# Altium schematic symbol library Regulator_Switching.SchLib: 1120 symbols (part 2 of 8) (continued)
## LM2841Y
designator *  value LM2841Y  Reference: U
ki_keywords: Miniature Step-Down Buck Voltage Regulator; ki_description: 300mA 42V Input Step-Down DC-DC Regulator, Adjustable Output Voltage, 1.25MHz, TSOT-23-5; ki_fp_filters: TSOT?23*; Footprint: Package_TO_SOT_SMD:TSOT-23-6; Datasheet: http://www.ti.com/lit/ds/symlink/lm2842-q1.pdf
pins: 1 BOOST, 2 GND, 3 FB, 4 EN, 5 VIN, 6 SW

## LM2842X
designator *  value LM2842X  Reference: U
ki_keywords: Miniature Step-Down Buck Voltage Regulator; ki_description: 600mA 42V Input Step-Down DC-DC Regulator, Adjustable Output Voltage, 550kHz, TSOT-23-5; ki_fp_filters: TSOT?23*; Footprint: Package_TO_SOT_SMD:TSOT-23-6; Datasheet: http://www.ti.com/lit/ds/symlink/lm2842-q1.pdf
pins: 1 BOOST, 2 GND, 3 FB, 4 EN, 5 VIN, 6 SW

## LM2842Y
designator *  value LM2842Y  Reference: U
ki_keywords: Miniature Step-Down Buck Voltage Regulator; ki_description: 600mA 42V Input Step-Down DC-DC Regulator, Adjustable Output Voltage, 1.25MHz, TSOT-23-5; ki_fp_filters: TSOT?23*; Footprint: Package_TO_SOT_SMD:TSOT-23-6; Datasheet: http://www.ti.com/lit/ds/symlink/lm2842-q1.pdf
pins: 1 BOOST, 2 GND, 3 FB, 4 EN, 5 VIN, 6 SW

## LM3150MH
designator *  value LM3150MH  Reference: U
ki_keywords: Buck step-down converter; ki_description: 42V Wide Vin synchronous Buck controller, HTSSOP-14; ki_fp_filters: HTSSOP*4.4x5mm*P0.65*; Footprint: Package_SO:HTSSOP-14-1EP_4.4x5mm_P0.65mm_EP3.4x5mm_Mask3x3.1mm; Datasheet: http://www.ti.com/lit/ds/symlink/lm3150.pdf
pins: 1 VCC, 2 VIN, 3 EN, 4 FB, 5 SGND, 6 SS, 7 RON, 8 ILIM, 9 SGND hidden, 10 SW, 11 HG, 12 BST, 13 LG, 14 PGND, 15 SGND hidden

## LM3407MY
designator *  value LM3407MY  Reference: U
ki_keywords: LED Step-Down Switching Regulator; ki_description: LED Lighting CC Floating Buck Switching Regulator, MSOP-8; ki_fp_filters: MSOP*1EP*3x3mm*P0.65mm*; Footprint: Package_SO:MSOP-8-1EP_3x3mm_P0.65mm_EP1.73x1.85mm_ThermalVias; Datasheet: http://www.ti.com/lit/ds/symlink/lm3407.pdf
pins: 1 ISNS, 2 DIM, 3 EN, 4 FS, 5 VIN, 6 VCC, 7 GND, 8 LX, 9 GNDPAD

## LM3578
designator *  value LM3578  Reference: U
ki_keywords: switching regulator; ki_description: 750mA, Switching Regulator, adjustable output voltage, DIP-8/SOIC-8; ki_fp_filters: DIP*W7.62mm* SOIC*3.9x4.9mm*; Datasheet: http://www.ti.com/lit/ds/symlink/lm3578a.pdf
pins: 1 E-, 2 E+, 3 CAP, 4 GND, 5 E, 6 C, 7 ILIM, 8 VIN

## LM3670MF
designator *  value LM3670MF  Reference: U
ki_keywords: DC-DC buck converter step down voltage regulator; ki_description: Miniature Step-Down DC-DC Converter for Ultralow Voltage Circuits, 2.5V < Vin < 5.5V, adjustable output voltage, SOT-23-5; ki_fp_filters: TSOT?23*; Footprint: Package_TO_SOT_SMD:TSOT-23-5; Datasheet: http://www.ti.com/lit/ds/symlink/lm3670.pdf
pins: 1 Vin, 2 GND, 3 EN, 4 FB, 5 SW

## LM5001MA
designator *  value LM5001MA  Reference: U
ki_keywords: High-Voltage Switch-mode Regulator Flyback SEPIC Boost; ki_description: 1A, High Voltage (75V) Switch-Mode Regulator, Adjustable Output Voltage, SOIC-8; ki_fp_filters: SOIC*3.9x4.9mm*P1.27mm*; Footprint: Package_SO:SOIC-8_3.9x4.9mm_P1.27mm; Datasheet: http://www.ti.com/lit/ds/symlink/lm5001.pdf
pins: 1 SW, 2 VIN, 3 VCC, 4 GND, 5 RT, 6 FB, 7 COMP, 8 EN

## LM5006MM
designator *  value LM5006MM  Reference: U
ki_keywords: Constant On-Time Buck Switching Regulator; ki_description: 600mA, 80V Constant On-Time Buck Switching Regulator, MSOP-10; ki_fp_filters: MSOP*3x3mm*P0.5mm*; Footprint: Package_SO:MSOP-10_3x3mm_P0.5mm; Datasheet: http://www.ti.com/lit/ds/symlink/lm5006.pdf
pins: 1 SW, 2 BST, 3 LG, 4 RTN, 5 UV, 6 UVO, 7 FB, 8 RT/SD, 9 VCC, 10 VIN

## LM5007MM
designator *  value LM5007MM  Reference: U
ki_keywords: Step-Down Switching Regulator; ki_description: 700mA, High Voltage (80V) Step-Down Switching Regulator, Adjustable Output Voltage, MSOP-8; ki_fp_filters: MSOP*3x3mm*P0.65mm*; Footprint: Package_SO:MSOP-8_3x3mm_P0.65mm; Datasheet: http://www.ti.com/lit/ds/symlink/lm5007.pdf
pins: 1 SW, 2 BST, 3 RCL, 4 RTN, 5 FB, 6 RON/SD, 7 VCC, 8 VIN

## LM5007SD
designator *  value LM5007SD  Reference: U
ki_keywords: Step-Down Switching Regulator; ki_description: 700mA, High Voltage (80V) Step-Down Switching Regulator, Adjustable Output Voltage, WSON-8; ki_fp_filters: WSON*1EP*4x4mm*P0.8mm*; Footprint: Package_SON:WSON-8-1EP_4x4mm_P0.8mm_EP2.6x3mm; Datasheet: http://www.ti.com/lit/ds/symlink/lm5007.pdf
pins: 1 SW, 2 BST, 3 RCL, 4 RTN, 5 FB, 6 RON/SD, 7 VCC, 8 VIN, 9 PAD

## LM5008MM
designator *  value LM5008MM  Reference: U
ki_keywords: Step-Down Switching Regulator; ki_description: 500mA, High Voltage (100V) Step-Down Switching Regulator, Adjustable Output Voltage, MSOP-8; ki_fp_filters: MSOP*3x3mm*P0.65mm*; Footprint: Package_SO:MSOP-8_3x3mm_P0.65mm; Datasheet: http://www.ti.com/lit/ds/symlink/lm5008.pdf
pins: 1 SW, 2 BST, 3 RCL, 4 RTN, 5 FB, 6 RON/SD, 7 VCC, 8 VIN

## LM5008SD
designator *  value LM5008SD  Reference: U
ki_keywords: Step-Down Switching Regulator; ki_description: 500mA, High Voltage (100V) Step-Down Switching Regulator, Adjustable Output Voltage, WSON-8; ki_fp_filters: WSON*1EP*4x4mm*P0.8mm*; Footprint: Package_SON:WSON-8-1EP_4x4mm_P0.8mm_EP2.6x3mm; Datasheet: http://www.ti.com/lit/ds/symlink/lm5008.pdf
pins: 1 SW, 2 BST, 3 RCL, 4 RTN, 5 FB, 6 RON/SD, 7 VCC, 8 VIN, 9 PAD

## LM5009MM
designator *  value LM5009MM  Reference: U
ki_keywords: Step-Down Switching Regulator; ki_description: 150mA, High Voltage (80V) Step-Down Switching Regulator, Adjustable Output Voltage, MSOP-8; ki_fp_filters: MSOP*3x3mm*P0.65mm*; Footprint: Package_SO:MSOP-8_3x3mm_P0.65mm; Datasheet: http://www.ti.com/lit/ds/symlink/lm5009.pdf
pins: 1 SW, 2 BST, 3 RCL, 4 RTN, 5 FB, 6 RON/SD, 7 VCC, 8 VIN

## LM5009SD
designator *  value LM5009SD  Reference: U
ki_keywords: Step-Down Switching Regulator; ki_description: 500mA, High Voltage (80V) Step-Down Switching Regulator, Adjustable Output Voltage, WSON-8; ki_fp_filters: WSON*1EP*4x4mm*P0.8mm*; Footprint: Package_SON:WSON-8-1EP_4x4mm_P0.8mm_EP2.6x3mm; Datasheet: http://www.ti.com/lit/ds/symlink/lm5009.pdf
pins: 1 SW, 2 BST, 3 RCL, 4 RTN, 5 FB, 6 RON/SD, 7 VCC, 8 VIN, 9 PAD

## LM5017MR
designator *  value LM5017MR  Reference: U
ki_keywords: Step-Down Switching Regulator High Voltage; ki_description: 600mA, 100V Step-Down Switching Regulator, PowerSO-8; ki_fp_filters: SOIC*1EP*3.9x4.9mm*P1.27mm*; Footprint: Package_SO:SOIC-8-1EP_3.9x4.9mm_P1.27mm_EP2.95x4.9mm_Mask2.71x3.4mm_ThermalVias; Datasheet: http://www.ti.com/lit/ds/symlink/lm5017.pdf
pins: 1 RTN, 2 VIN, 3 ULVO, 4 RON, 5 FB, 6 VCC, 7 BST, 8 SW, 9 RTNPAD

## LM5017SD
designator *  value LM5017SD  Reference: U
ki_keywords: Step-Down Switching Regulator High Voltage; ki_description: 600mA, 100V Step-Down Switching Regulator, WSON-8; ki_fp_filters: WSON*1EP*4x4mm*P0.8mm*; Footprint: Package_SON:WSON-8-1EP_4x4mm_P0.8mm_EP1.98x3mm; Datasheet: http://www.ti.com/lit/ds/symlink/lm5017.pdf
pins: 1 RTN, 2 VIN, 3 ULVO, 4 RON, 5 FB, 6 VCC, 7 BST, 8 SW, 9 RTNPAD

## LM5022MM
designator *  value LM5022MM  Reference: U
ki_keywords: boost switching controller; ki_description: 60-V Low-Side Controller for Boost and SEPIC, MSOP-10; ki_fp_filters: MSOP*3x3mm*P0.5mm*; Footprint: Package_SO:MSOP-10_3x3mm_P0.5mm; Datasheet: http://www.ti.com/lit/ds/symlink/lm5022.pdf
pins: 1 VIN, 2 FB, 3 COMP, 4 VCC, 5 OUT, 6 GND, 7 UVLO, 8 CS, 9 RT, 10 SS

## LM5088-1
designator *  value LM5088-1  Reference: U
ki_keywords: step down buck high voltage; ki_description: Wide Input Range Non-Synchronous Buck Controller, Frequency Dithering, 75V, HTSSOP-16; ki_fp_filters: HTSSOP*1EP*4.4x5mm*P0.65mm*; Footprint: Package_SO:HTSSOP-16-1EP_4.4x5mm_P0.65mm_EP3.4x5mm_Mask3x3mm_ThermalVias; Datasheet: http://www.ti.com/lit/ds/symlink/lm5088.pdf
pins: 1 VIN, 2 EN, 3 SS, 4 RAMP, 5 RT/SYNC, 6 GND, 7 COMP, 8 FB, 9 OUT, 10 DITH, 11 CSG, 12 CS, 13 SW, 14 HG, 15 BOOT, 16 VCC, 17 PGND

## LM5088-2
designator *  value LM5088-2  Reference: U
ki_keywords: step down buck high voltage; ki_description: Wide Input Range Non-Synchronous Buck Controller, Hiccup Mode Restart, 75V, HTSSOP-16; ki_fp_filters: HTSSOP*1EP*4.4x5mm*P0.65mm*; Footprint: Package_SO:HTSSOP-16-1EP_4.4x5mm_P0.65mm_EP3.4x5mm_Mask3x3mm_ThermalVias; Datasheet: http://www.ti.com/lit/ds/symlink/lm5088.pdf
pins: 1 VIN, 2 EN, 3 SS, 4 RAMP, 5 RT/SYNC, 6 GND, 7 COMP, 8 FB, 9 OUT, 10 RES, 11 CSG, 12 CS, 13 SW, 14 HG, 15 BOOT, 16 VCC, 17 PGND

## LM5118MH
designator *  value LM5118MH  Reference: U
ki_keywords: Buck Boost step-up step-down; ki_description: Wide Voltage Range Buck-Boost Controller, HTSSOP-20; ki_fp_filters: Texas*PWP0020A*; Footprint: Package_SO:Texas_PWP0020A; Datasheet: https://www.ti.com/lit/ds/symlink/lm5118.pdf
pins: 1 VIN, 2 UVLO, 3 RT, 4 EN, 5 RAMP, 6 AGND, 7 SS, 8 FB, 9 COMP, 10 VOUT, 11 SYNC, 12 CS, 13 CSG, 14 PGND, 15 LO, 16 VCC, 17 VCCX, 18 HB, 19 HO, 20 HS, 21 EP

## LM5161PWP
designator *  value LM5161PWP  Reference: U
ki_keywords: step-down dc-dc buck regulator adjustable; ki_description: 1A Synchronous Buck/Fly-buck Converter, 4.5V-100V input, adjustable output voltage, HTSSOP-14; ki_fp_filters: HTSSOP*1EP*4.4x5*P0.65mm*; Footprint: Package_SO:HTSSOP-14-1EP_4.4x5mm_P0.65mm_EP3.4x5mm_Mask3x3.1mm; Datasheet: http://www.ti.com/lit/ds/symlink/lm5161.pdf
pins: 1 AGND, 2 PGND, 3 VIN, 4 EN/UVLO, 5 RON, 6 SS, 7 NC hidden, 8 FPWM, 9 FB, 10 VCC, 11 BST, 12 SW, 13 SW hidden, 14 NC hidden, 15 AGND hidden

## LM5164DDA
designator *  value LM5164DDA  Reference: U
ki_keywords: step-down dc-dc buck regulator adjustable; ki_description: 1A synchronous buck converter with ultra-low IQ, 6V - 100V input, adjustable output voltage, HSOP-8; ki_fp_filters: HSOP*1EP*3.9x4.9*P1.27mm*; Footprint: Package_SO:HSOP-8-1EP_3.9x4.9mm_P1.27mm_EP2.41x3.1mm_ThermalVias; Datasheet: https://www.ti.com/lit/ds/symlink/lm5164.pdf?ts=1598311864250&ref_url=https%253A%252F%252Fwww.ti.com%252Fproduct%252FLM5164%253FHQS%253DTI-null-null-octopart-df-pf-null-wwe
pins: 1 GND, 2 VIN, 3 EN/UVLO, 4 RON, 5 FB, 6 PGOOD, 7 BST, 8 SW, 9 EP

## LM5165
designator *  value LM5165  Reference: U
ki_keywords: step-down dc-dc buck regulator adjustable; ki_description: 150mA Synchronous Buck Converter With Ultra-Low IQ, 3V-65V input, adjustable output voltage, DFN-10; ki_fp_filters: Texas*PVSON*N10*; Footprint: Package_SON:Texas_S-PVSON-N10_ThermalVias; Datasheet: http://www.ti.com/lit/ds/symlink/lm5165.pdf
pins: 1 SW, 2 VIN, 3 ILIM, 4 SS, 5 RT, 6 PGOOD, 7 EN, 8 FB, 9 HYS, 10 GND, 11 PAD

## LM5165X
designator *  value LM5165X  Reference: U
ki_keywords: step-down dc-dc buck regulator fixed 5V; ki_description: 150mA Synchronous Buck Converter With Ultra-Low IQ, 3V-65V input, 5.0V fixed output voltage, DFN-10; ki_fp_filters: Texas*PVSON*N10*; Footprint: Package_SON:Texas_S-PVSON-N10_ThermalVias; Datasheet: http://www.ti.com/lit/ds/symlink/lm5165.pdf
pins: 1 SW, 2 VIN, 3 ILIM, 4 SS, 5 RT, 6 PGOOD, 7 EN, 8 VOUT, 9 HYS, 10 GND, 11 PAD

## LM5165Y
designator *  value LM5165Y  Reference: U
ki_keywords: step-down dc-dc buck regulator fixed 3V3; ki_description: 150mA Synchronous Buck Converter With Ultra-Low IQ, 3V-65V input, 3.3V fixed output voltage, DFN-10; ki_fp_filters: Texas*PVSON*N10*; Footprint: Package_SON:Texas_S-PVSON-N10_ThermalVias; Datasheet: http://www.ti.com/lit/ds/symlink/lm5165.pdf
pins: 1 SW, 2 VIN, 3 ILIM, 4 SS, 5 RT, 6 PGOOD, 7 EN, 8 VOUT, 9 HYS, 10 GND, 11 PAD

## LM5166
designator *  value LM5166  Reference: U
ki_keywords: step-down dc-dc buck regulator adjustable; ki_description: 500mA Synchronous Buck Converter With Ultra-Low IQ, 3V-65V input, adjustable output voltage, DFN-10; ki_fp_filters: Texas*PVSON*N10*; Footprint: Package_SON:Texas_S-PVSON-N10_ThermalVias; Datasheet: http://www.ti.com/lit/ds/symlink/lm5166.pdf
pins: 1 SW, 2 VIN, 3 ILIM, 4 SS, 5 RT, 6 PGOOD, 7 EN, 8 FB, 9 HYS, 10 GND, 11 PAD

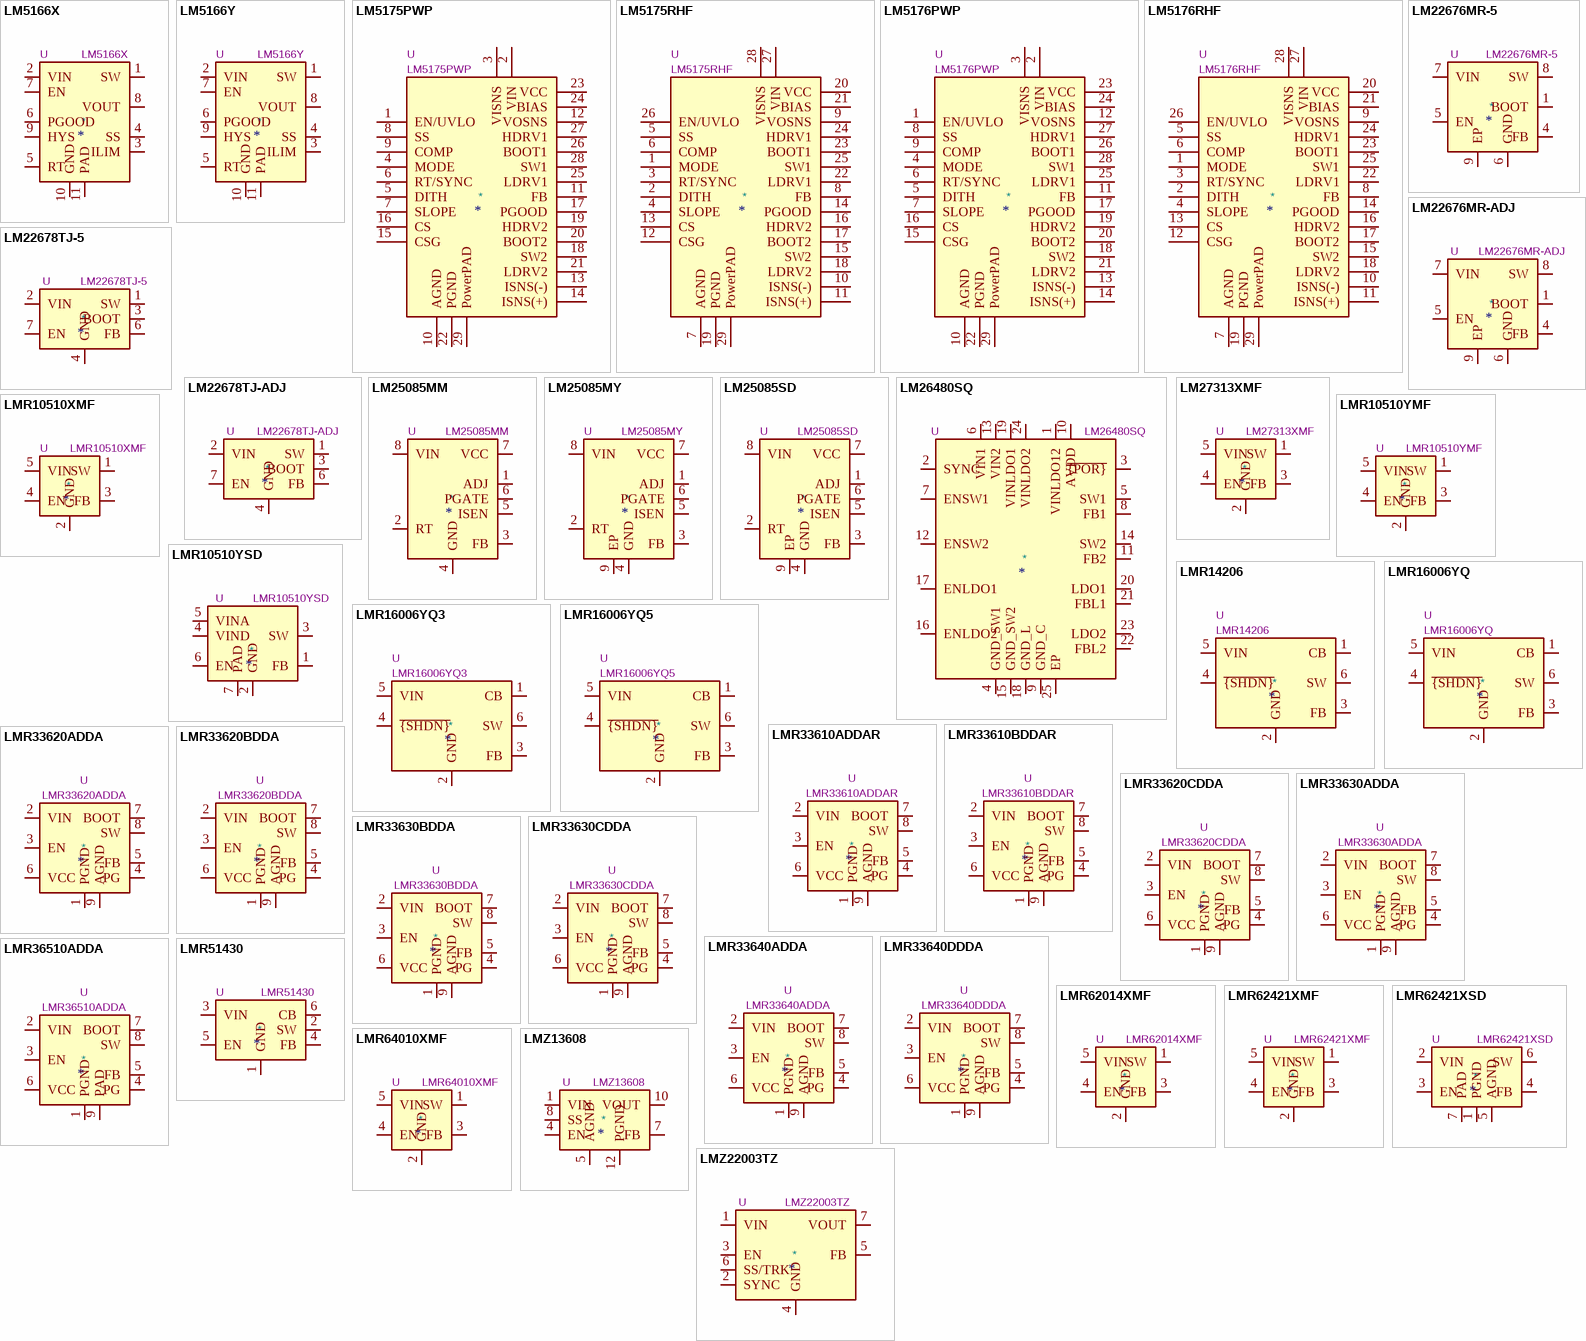
[diagram p7: symbols LM5166X to LMZ22003TZ]

## LM5166X
designator *  value LM5166X  Reference: U
ki_keywords: step-down dc-dc buck regulator fixed 5V; ki_description: 500mA Synchronous Buck Converter With Ultra-Low IQ, 3V-65V input, 5.0V fixed output voltage, DFN-10; ki_fp_filters: Texas*PVSON*N10*; Footprint: Package_SON:Texas_S-PVSON-N10_ThermalVias; Datasheet: http://www.ti.com/lit/ds/symlink/lm5166.pdf
pins: 1 SW, 2 VIN, 3 ILIM, 4 SS, 5 RT, 6 PGOOD, 7 EN, 8 VOUT, 9 HYS, 10 GND, 11 PAD

## LM5166Y
designator *  value LM5166Y  Reference: U
ki_keywords: step-down dc-dc buck regulator fixed 3V3; ki_description: 500mA Synchronous Buck Converter With Ultra-Low IQ, 3V-65V input, 3.3V fixed output voltage, DFN-10; ki_fp_filters: Texas*PVSON*N10*; Footprint: Package_SON:Texas_S-PVSON-N10_ThermalVias; Datasheet: http://www.ti.com/lit/ds/symlink/lm5166.pdf
pins: 1 SW, 2 VIN, 3 ILIM, 4 SS, 5 RT, 6 PGOOD, 7 EN, 8 VOUT, 9 HYS, 10 GND, 11 PAD

## LM5175PWP
designator *  value LM5175PWP  Reference: U
ki_keywords: Buck Boost step-up step-down; ki_description: 42-V wide Vin synchronous 4-switch Buck-Boost controller, HTSSOP-28 package; ki_fp_filters: HTSSOP*4.4x9.7mm*P0.65*ThermalVias*; Footprint: Package_SO:HTSSOP-28-1EP_4.4x9.7mm_P0.65mm_EP3.4x9.5mm_ThermalVias; Datasheet: http://www.ti.com/lit/ds/symlink/lm5175.pdf
pins: 1 EN/UVLO, 2 VIN, 3 VISNS, 4 MODE, 5 DITH, 6 RT/SYNC, 7 SLOPE, 8 SS, 9 COMP, 10 AGND, 11 FB, 12 VOSNS, 13 ISNS(-), 14 ISNS(+), 15 CSG, 16 CS, 17 PGOOD, 18 SW2, 19 HDRV2, 20 BOOT2, 21 LDRV2, 22 PGND, 23 VCC, 24 BIAS, 25 LDRV1, 26 BOOT1, 27 HDRV1, 28 SW1, 29 PowerPAD

## LM5175RHF
designator *  value LM5175RHF  Reference: U
ki_keywords: Buck Boost step-up step-down; ki_description: 42-V wide Vin synchronous 4-switch Buck-Boost controller, QFN-28 package; ki_fp_filters: VQFN*4x5mm*P0.5*; Footprint: Package_DFN_QFN:VQFN-28-1EP_4x5mm_P0.5mm_EP2.55x3.55mm; Datasheet: http://www.ti.com/lit/ds/symlink/lm5175.pdf
pins: 1 MODE, 2 DITH, 3 RT/SYNC, 4 SLOPE, 5 SS, 6 COMP, 7 AGND, 8 FB, 9 VOSNS, 10 ISNS(-), 11 ISNS(+), 12 CSG, 13 CS, 14 PGOOD, 15 SW2, 16 HDRV2, 17 BOOT2, 18 LDRV2, 19 PGND, 20 VCC, 21 BIAS, 22 LDRV1, 23 BOOT1, 24 HDRV1, 25 SW1, 26 EN/UVLO, 27 VIN, 28 VISNS, 29 PowerPAD

## LM5176PWP
designator *  value LM5176PWP  Reference: U
ki_keywords: Buck Boost step-up step-down; ki_description: 55-V wide Vin synchronous 4-switch Buck-Boost controller, HTSSOP-28 package; ki_fp_filters: HTSSOP*4.4x9.7mm*P0.65*ThermalVias*; Footprint: Package_SO:HTSSOP-28-1EP_4.4x9.7mm_P0.65mm_EP3.4x9.5mm_ThermalVias; Datasheet: http://www.ti.com/lit/ds/symlink/lm5176.pdf
pins: 1 EN/UVLO, 2 VIN, 3 VISNS, 4 MODE, 5 DITH, 6 RT/SYNC, 7 SLOPE, 8 SS, 9 COMP, 10 AGND, 11 FB, 12 VOSNS, 13 ISNS(-), 14 ISNS(+), 15 CSG, 16 CS, 17 PGOOD, 18 SW2, 19 HDRV2, 20 BOOT2, 21 LDRV2, 22 PGND, 23 VCC, 24 BIAS, 25 LDRV1, 26 BOOT1, 27 HDRV1, 28 SW1, 29 PowerPAD

## LM5176RHF
designator *  value LM5176RHF  Reference: U
ki_keywords: Buck Boost step-up step-down; ki_description: 55-V wide Vin synchronous 4-switch Buck-Boost controller, QFN-28 package; ki_fp_filters: VQFN*4x5mm*P0.5*; Footprint: Package_DFN_QFN:VQFN-28-1EP_4x5mm_P0.5mm_EP2.55x3.55mm; Datasheet: http://www.ti.com/lit/ds/symlink/lm5176.pdf
pins: 1 MODE, 2 DITH, 3 RT/SYNC, 4 SLOPE, 5 SS, 6 COMP, 7 AGND, 8 FB, 9 VOSNS, 10 ISNS(-), 11 ISNS(+), 12 CSG, 13 CS, 14 PGOOD, 15 SW2, 16 HDRV2, 17 BOOT2, 18 LDRV2, 19 PGND, 20 VCC, 21 BIAS, 22 LDRV1, 23 BOOT1, 24 HDRV1, 25 SW1, 26 EN/UVLO, 27 VIN, 28 VISNS, 29 PowerPAD

## LM22676MR-5
designator *  value LM22676MR-5  Reference: U
ki_keywords: DC/DC Buck Converter 3A; ki_description: 3A Step-Down Switching Voltage Regulater, 4.5-42V Input, 5V Output, 500kHz Switching Frequency, SOIC-8; ki_fp_filters: TI*SO*PowerPAD*; Footprint: Package_SO:TI_SO-PowerPAD-8; Datasheet: http://www.ti.com/lit/ds/symlink/lm22676.pdf
pins: 1 BOOT, 2 NC hidden, 3 NC hidden, 4 FB, 5 EN, 6 GND, 7 VIN, 8 SW, 9 EP

## LM22676MR-ADJ
designator *  value LM22676MR-ADJ  Reference: U
ki_keywords: DC/DC Buck Converter 3A; ki_description: 3A Step-Down Switching Voltage Regulater, 4.5-42V Input, Adjustable Output, 500kHz Switching Frequency, SOIC-8; ki_fp_filters: TI*SO*PowerPAD*; Footprint: Package_SO:TI_SO-PowerPAD-8; Datasheet: http://www.ti.com/lit/ds/symlink/lm22676.pdf
pins: 1 BOOT, 2 NC hidden, 3 NC hidden, 4 FB, 5 EN, 6 GND, 7 VIN, 8 SW, 9 EP

## LM22678TJ-5
designator *  value LM22678TJ-5  Reference: U
ki_keywords: DC/DC Buck Converter 5A; ki_description: 5A Step-Down Switching Voltage Regulater, 4.5-42V Input, 5V Output, 500kHz Switching Frequency, TO-263; ki_fp_filters: TO?263*; Footprint: Package_TO_SOT_SMD:TO-263-7_TabPin8; Datasheet: https://www.ti.com/lit/ds/symlink/lm22678.pdf
pins: 1 SW, 2 VIN, 3 BOOT, 4 GND, 5 NC hidden, 6 FB, 7 EN, 8 GND hidden

## LM22678TJ-ADJ
designator *  value LM22678TJ-ADJ  Reference: U
ki_keywords: DC/DC Buck Converter 5A; ki_description: 5A Step-Down Switching Voltage Regulater, 4.5-42V Input, Adjustable Output, 500kHz Switching Frequency, TO-263; ki_fp_filters: TO?263*; Footprint: Package_TO_SOT_SMD:TO-263-7_TabPin8; Datasheet: https://www.ti.com/lit/ds/symlink/lm22678.pdf
pins: 1 SW, 2 VIN, 3 BOOT, 4 GND, 5 NC hidden, 6 FB, 7 EN, 8 GND hidden

## LM25085MM
designator *  value LM25085MM  Reference: U
ki_keywords: buck switching controller; ki_description: 42V Constant On-Time PFET Buck Switching Controller, MSOP-8; ki_fp_filters: MSOP*3x3mm*P0.65mm*; Footprint: Package_SO:MSOP-8_3x3mm_P0.65mm; Datasheet: http://www.ti.com/lit/ds/symlink/lm25085.pdf
pins: 1 ADJ, 2 RT, 3 FB, 4 GND, 5 ISEN, 6 PGATE, 7 VCC, 8 VIN

## LM25085MY
designator *  value LM25085MY  Reference: U
ki_keywords: buck switching controller; ki_description: 42V Constant On-Time PFET Buck Switching Controller, MSOP-8-EP; ki_fp_filters: MSOP*1EP*3x3mm*P0.65mm*; Footprint: Package_SO:MSOP-8-1EP_3x3mm_P0.65mm_EP1.73x1.85mm_ThermalVias; Datasheet: http://www.ti.com/lit/ds/symlink/lm25085.pdf
pins: 1 ADJ, 2 RT, 3 FB, 4 GND, 5 ISEN, 6 PGATE, 7 VCC, 8 VIN, 9 EP

## LM25085SD
designator *  value LM25085SD  Reference: U
ki_keywords: buck switching controller; ki_description: 42V Constant On-Time PFET Buck Switching Controller, WSON-8; ki_fp_filters: WSON*1EP*3x3mm*P0.5mm*EP1.6x2.0mm*; Footprint: Package_SON:WSON-8-1EP_3x3mm_P0.5mm_EP1.6x2.0mm; Datasheet: http://www.ti.com/lit/ds/symlink/lm25085.pdf
pins: 1 ADJ, 2 RT, 3 FB, 4 GND, 5 ISEN, 6 PGATE, 7 VCC, 8 VIN, 9 EP

## LM26480SQ
designator *  value LM26480SQ  Reference: U
ki_keywords: Dual Buck Regulator LDO 2MHz 1.5A 300mA; ki_description: Dual 1.5A 2MHz Buck Regulators and Dual 300mA LDOs, WQFN-24; ki_fp_filters: WQFN*1EP*4x4mm*P0.5mm*; Footprint: Package_DFN_QFN:WQFN-24-1EP_4x4mm_P0.5mm_EP2.6x2.6mm; Datasheet: http://www.ti.com/lit/ds/symlink/lm26480.pdf
pins: 1 VINLDO12, 2 SYNC, 3 ~{{POR}}, 4 GND_SW1, 5 SW1, 6 VIN1, 7 ENSW1, 8 FB1, 9 GND_C, 10 AVDD, 11 FB2, 12 ENSW2, 13 VIN2, 14 SW2, 15 GND_SW2, 16 ENLDO2, 17 ENLDO1, 18 GND_L, 19 VINLDO1, 20 LDO1, 21 FBL1, 22 FBL2, 23 LDO2, 24 VINLDO2, 25 EP

## LM27313XMF
designator *  value LM27313XMF  Reference: U
ki_keywords: Miniature Step-Up Boost Voltage Regulator; ki_description: 1A, 28Vout Boost Voltage Regulator, 1.6MHz Frequency, SOT-23-5; ki_fp_filters: SOT?23*; Footprint: Package_TO_SOT_SMD:SOT-23-5; Datasheet: http://www.ti.com/lit/ds/symlink/lm27313.pdf
pins: 1 SW, 2 GND, 3 FB, 4 EN, 5 VIN

## LMR10510XMF
designator *  value LMR10510XMF  Reference: U
ki_keywords: Miniature Step-Down Buck Voltage Regulator; ki_description: 1A, 5.5V Step-Down Voltage Regulator, 1.6MHz Frequency, SOT-23-5; ki_fp_filters: SOT?23*; Footprint: Package_TO_SOT_SMD:SOT-23-5; Datasheet: http://www.ti.com/lit/ds/symlink/lmr10510.pdf
pins: 1 SW, 2 GND, 3 FB, 4 EN, 5 VIN

## LMR10510YMF
designator *  value LMR10510YMF  Reference: U
ki_keywords: Miniature Step-Down Buck Voltage Regulator; ki_description: 1A, 5.5V Step-Down Voltage Regulator, 3MHz Frequency, SOT-23-5; ki_fp_filters: SOT?23*; Footprint: Package_TO_SOT_SMD:SOT-23-5; Datasheet: http://www.ti.com/lit/ds/symlink/lmr10510.pdf
pins: 1 SW, 2 GND, 3 FB, 4 EN, 5 VIN

## LMR10510YSD
designator *  value LMR10510YSD  Reference: U
ki_keywords: Miniature Step-Down Buck Voltage Regulator; ki_description: 1A, 5.5V Step-Down Voltage Regulator, 3MHz Frequency, WSON-6; ki_fp_filters: WSON*EP*3x3mm*P0.95mm*; Footprint: Package_SON:WSON-6-1EP_3x3mm_P0.95mm; Datasheet: http://www.ti.com/lit/ds/symlink/lmr10510.pdf
pins: 1 FB, 2 GND, 3 SW, 4 VIND, 5 VINA, 6 EN, 7 PAD

## LMR14206
designator *  value LMR14206  Reference: U
ki_keywords: simple-switcher buck step-down voltage-regulator; ki_description: Simple Switcher Buck Regulator, Vin=4.5-42V, Iout=600mA, Adjustable output voltage, SOT-23-6 package; ki_fp_filters: SOT?23*; Footprint: Package_TO_SOT_SMD:SOT-23-6; Datasheet: http://www.ti.com/lit/ds/symlink/lmr14206.pdf
pins: 1 CB, 2 GND, 3 FB, 4 ~{{SHDN}}, 5 VIN, 6 SW

## LMR16006YQ
designator *  value LMR16006YQ  Reference: U
ki_keywords: simple-switcher buck step-down voltage-regulator; ki_description: Simple Switcher Buck Regulator, Vin=4-40V, Iout=600mA, Adjustable output voltage, SOT-23-6 package; ki_fp_filters: SOT?23*; Footprint: Package_TO_SOT_SMD:SOT-23-6; Datasheet: http://www.ti.com/lit/ds/symlink/lmr16006y-q1.pdf
pins: 1 CB, 2 GND, 3 FB, 4 ~{{SHDN}}, 5 VIN, 6 SW

## LMR16006YQ3
designator *  value LMR16006YQ3  Reference: U
ki_keywords: simple-switcher buck step-down voltage-regulator; ki_description: Simple Switcher Buck Regulator, Vin=4-40V, Iout=600mA, Fixed 3.3V output voltage, SOT-23-6 package; ki_fp_filters: SOT?23*; Footprint: Package_TO_SOT_SMD:SOT-23-6; Datasheet: http://www.ti.com/lit/ds/symlink/lmr16006y-q1.pdf
pins: 1 CB, 2 GND, 3 FB, 4 ~{{SHDN}}, 5 VIN, 6 SW

## LMR16006YQ5
designator *  value LMR16006YQ5  Reference: U
ki_keywords: simple-switcher buck step-down voltage-regulator; ki_description: Simple Switcher Buck Regulator, Vin=4-40V, Iout=600mA, Fixed 5.0V output voltage, SOT-23-6 package; ki_fp_filters: SOT?23*; Footprint: Package_TO_SOT_SMD:SOT-23-6; Datasheet: http://www.ti.com/lit/ds/symlink/lmr16006y-q1.pdf
pins: 1 CB, 2 GND, 3 FB, 4 ~{{SHDN}}, 5 VIN, 6 SW

## LMR33610ADDAR
designator *  value LMR33610ADDAR  Reference: U
ki_keywords: simple-switcher synchronous buck step-down voltage-regulator; ki_description: Simple Switcher Synchronous Buck Regulator, Vin=3.8-36V, Iout=1A, F=400kHz, Adjustable output voltage, HSOP-8; ki_fp_filters: Texas*HSOP*1EP*; Footprint: Package_SO:Texas_HSOP-8-1EP_3.9x4.9mm_P1.27mm_ThermalVias; Datasheet: http://www.ti.com/lit/ds/symlink/lmr33610.pdf
pins: 1 PGND, 2 VIN, 3 EN, 4 PG, 5 FB, 6 VCC, 7 BOOT, 8 SW, 9 AGND

## LMR33610BDDAR
designator *  value LMR33610BDDAR  Reference: U
ki_keywords: simple-switcher synchronous buck step-down voltage-regulator; ki_description: Simple Switcher Synchronous Buck Regulator, Vin=3.8-36V, Iout=1A, F=1400kHz, Adjustable output voltage, HSOP-8; ki_fp_filters: Texas*HSOP*1EP*; Footprint: Package_SO:Texas_HSOP-8-1EP_3.9x4.9mm_P1.27mm_ThermalVias; Datasheet: http://www.ti.com/lit/ds/symlink/lmr33610.pdf
pins: 1 PGND, 2 VIN, 3 EN, 4 PG, 5 FB, 6 VCC, 7 BOOT, 8 SW, 9 AGND

## LMR33620ADDA
designator *  value LMR33620ADDA  Reference: U
ki_keywords: simple-switcher synchronous buck step-down voltage-regulator; ki_description: Simple Switcher Synchronous Buck Regulator, Vin=3.8-36V, Iout=2A, F=400kHz, Adjustable output voltage, HSOP-8; ki_fp_filters: Texas*HSOP*1EP*; Footprint: Package_SO:Texas_HSOP-8-1EP_3.9x4.9mm_P1.27mm_ThermalVias; Datasheet: http://www.ti.com/lit/ds/symlink/lmr33620.pdf
pins: 1 PGND, 2 VIN, 3 EN, 4 PG, 5 FB, 6 VCC, 7 BOOT, 8 SW, 9 AGND

## LMR33620BDDA
designator *  value LMR33620BDDA  Reference: U
ki_keywords: simple-switcher synchronous buck step-down voltage-regulator; ki_description: Simple Switcher Synchronous Buck Regulator, Vin=3.8-36V, Iout=2A, F=1400kHz, Adjustable output voltage, HSOP-8; ki_fp_filters: Texas*HSOP*1EP*; Footprint: Package_SO:Texas_HSOP-8-1EP_3.9x4.9mm_P1.27mm_ThermalVias; Datasheet: http://www.ti.com/lit/ds/symlink/lmr33620.pdf
pins: 1 PGND, 2 VIN, 3 EN, 4 PG, 5 FB, 6 VCC, 7 BOOT, 8 SW, 9 AGND

## LMR33620CDDA
designator *  value LMR33620CDDA  Reference: U
ki_keywords: simple-switcher synchronous buck step-down voltage-regulator; ki_description: Simple Switcher Synchronous Buck Regulator, Vin=3.8-36V, Iout=2A, F=2100kHz, Adjustable output voltage, HSOP-8; ki_fp_filters: Texas*HSOP*1EP*; Footprint: Package_SO:Texas_HSOP-8-1EP_3.9x4.9mm_P1.27mm_ThermalVias; Datasheet: http://www.ti.com/lit/ds/symlink/lmr33640.pdf
pins: 1 PGND, 2 VIN, 3 EN, 4 PG, 5 FB, 6 VCC, 7 BOOT, 8 SW, 9 AGND

## LMR33630ADDA
designator *  value LMR33630ADDA  Reference: U
ki_keywords: simple-switcher synchronous buck step-down voltage-regulator; ki_description: Simple Switcher Synchronous Buck Regulator, Vin=3.8-36V, Iout=3A, F=400kHz, Adjustable output voltage, HSOP-8; ki_fp_filters: Texas*HSOP*1EP*; Footprint: Package_SO:Texas_HSOP-8-1EP_3.9x4.9mm_P1.27mm_ThermalVias; Datasheet: http://www.ti.com/lit/ds/symlink/lmr33630.pdf
pins: 1 PGND, 2 VIN, 3 EN, 4 PG, 5 FB, 6 VCC, 7 BOOT, 8 SW, 9 AGND

## LMR33630BDDA
designator *  value LMR33630BDDA  Reference: U
ki_keywords: simple-switcher synchronous buck step-down voltage-regulator; ki_description: Simple Switcher Synchronous Buck Regulator, Vin=3.8-36V, Iout=3A, F=1400kHz, Adjustable output voltage, HSOP-8; ki_fp_filters: Texas*HSOP*1EP*; Footprint: Package_SO:Texas_HSOP-8-1EP_3.9x4.9mm_P1.27mm_ThermalVias; Datasheet: http://www.ti.com/lit/ds/symlink/lmr33630.pdf
pins: 1 PGND, 2 VIN, 3 EN, 4 PG, 5 FB, 6 VCC, 7 BOOT, 8 SW, 9 AGND

## LMR33630CDDA
designator *  value LMR33630CDDA  Reference: U
ki_keywords: simple-switcher synchronous buck step-down voltage-regulator; ki_description: Simple Switcher Synchronous Buck Regulator, Vin=3.8-36V, Iout=3A, F=2100kHz, Adjustable output voltage, HSOP-8; ki_fp_filters: Texas*HSOP*1EP*; Footprint: Package_SO:Texas_HSOP-8-1EP_3.9x4.9mm_P1.27mm_ThermalVias; Datasheet: http://www.ti.com/lit/ds/symlink/lmr33630.pdf
pins: 1 PGND, 2 VIN, 3 EN, 4 PG, 5 FB, 6 VCC, 7 BOOT, 8 SW, 9 AGND

## LMR33640ADDA
designator *  value LMR33640ADDA  Reference: U
ki_keywords: simple-switcher synchronous buck step-down voltage-regulator; ki_description: Simple Switcher Synchronous Buck Regulator, Vin=3.8-36V, Iout=4A, F=400kHz, Adjustable output voltage, HSOP-8; ki_fp_filters: Texas*HSOP*1EP*; Footprint: Package_SO:Texas_HSOP-8-1EP_3.9x4.9mm_P1.27mm_ThermalVias; Datasheet: http://www.ti.com/lit/ds/symlink/lmr33640.pdf
pins: 1 PGND, 2 VIN, 3 EN, 4 PG, 5 FB, 6 VCC, 7 BOOT, 8 SW, 9 AGND

## LMR33640DDDA
designator *  value LMR33640DDDA  Reference: U
ki_keywords: simple-switcher synchronous buck step-down voltage-regulator; ki_description: Simple Switcher Synchronous Buck Regulator, Vin=3.8-36V, Iout=4A, F=1000kHz, Adjustable output voltage, HSOP-8; ki_fp_filters: Texas*HSOP*1EP*; Footprint: Package_SO:Texas_HSOP-8-1EP_3.9x4.9mm_P1.27mm_ThermalVias; Datasheet: http://www.ti.com/lit/ds/symlink/lmr33640.pdf
pins: 1 PGND, 2 VIN, 3 EN, 4 PG, 5 FB, 6 VCC, 7 BOOT, 8 SW, 9 AGND

## LMR36510ADDA
designator *  value LMR36510ADDA  Reference: U
ki_keywords: synchronous buck step-down; ki_description: Simple Switcher Synchronous Buck Regulator, Vin=4.2-65V, Iout=1A, F=400kHz, Adjustable output voltage, HSOP-8; ki_fp_filters: Texas*HTSOP*1EP*3.9x4.9mm*P1.27mm*EP2.95x4.9mm*Mask2.4x3.1mm*; Footprint: Package_SO:Texas_HTSOP-8-1EP_3.9x4.9mm_P1.27mm_EP2.95x4.9mm_Mask2.4x3.1mm_ThermalVias; Datasheet: http://www.ti.com/lit/ds/symlink/lmr36510.pdf
pins: 1 PGND, 2 VIN, 3 EN, 4 PG, 5 FB, 6 VCC, 7 BOOT, 8 SW, 9 PAD

## LMR51430
designator *  value LMR51430  Reference: U
ki_keywords: switching buck converter power-supply voltage regulator; ki_description: 4.5-V to 36-V, 3-A synchronous buck converter with 40-µA IQ, SOT-23-6; ki_fp_filters: SOT?23*; Footprint: Package_TO_SOT_SMD:SOT-23-6; Datasheet: https://www.ti.com/lit/ds/symlink/lmr51430.pdf
pins: 1 GND, 2 SW, 3 VIN, 4 FB, 5 EN, 6 CB

## LMR62014XMF
designator *  value LMR62014XMF  Reference: U
ki_keywords: Miniature Step-Up Boost Voltage Regulator; ki_description: 1.4A, 20Vout Step-Up Voltage Regulator, 1.6MHz Frequency, SOT-23-5; ki_fp_filters: SOT?23*; Footprint: Package_TO_SOT_SMD:SOT-23-5; Datasheet: http://www.ti.com/lit/ds/symlink/lmr62014.pdf
pins: 1 SW, 2 GND, 3 FB, 4 EN, 5 VIN

## LMR62421XMF
designator *  value LMR62421XMF  Reference: U
ki_keywords: Miniature Step-Up Boost SEPIC Voltage Regulator; ki_description: 2.1A, 24Vout Boost/SEPIC Voltage Regulator, 1.6MHz Frequency, SOT-23-5; ki_fp_filters: SOT?23*; Footprint: Package_TO_SOT_SMD:SOT-23-5; Datasheet: http://www.ti.com/lit/ds/symlink/lmr62421.pdf
pins: 1 SW, 2 GND, 3 FB, 4 EN, 5 VIN

## LMR62421XSD
designator *  value LMR62421XSD  Reference: U
ki_keywords: Miniature Step-Up Boost SEPIC Voltage Regulator; ki_description: 2.1A, 24Vout Step-Up Voltage Regulator, 1.6MHz Frequency, WSON-6; ki_fp_filters: WSON*EP*3x3mm*P0.95mm*; Footprint: Package_SON:WSON-6-1EP_3x3mm_P0.95mm; Datasheet: http://www.ti.com/lit/ds/symlink/lmr62421.pdf
pins: 1 PGND, 2 VIN, 3 EN, 4 FB, 5 AGND, 6 SW, 7 PAD

## LMR64010XMF
designator *  value LMR64010XMF  Reference: U
ki_keywords: Miniature Step-Up Boost Voltage Regulator; ki_description: 1A, 40Vout Step-Up Voltage Regulator, 1.6MHz Frequency, SOT-23-5; ki_fp_filters: SOT?23*; Footprint: Package_TO_SOT_SMD:SOT-23-5; Datasheet: http://www.ti.com/lit/ds/symlink/lmr64010.pdf
pins: 1 SW, 2 GND, 3 FB, 4 EN, 5 VIN

## LMZ13608
designator *  value LMZ13608  Reference: U
ki_keywords: Step-Down DC/DC Module; ki_description: 8A Adjustable Step-Down DC/DC Power Module in 15x15mm, Texas NDY0011A; ki_fp_filters: Texas*NDY0011A*; Footprint: Package_TO_SOT_SMD:Texas_NDY0011A; Datasheet: http://www.ti.com/lit/ds/snvs710i/snvs710i.pdf
pins: 1 VIN, 2 VIN hidden, 3 AGND hidden, 4 EN, 5 AGND, 6 AGND hidden, 7 FB, 8 SS, 9 NC hidden, 10 VOUT, 11 VOUT hidden, 12 PGND

## LMZ22003TZ
designator *  value LMZ22003TZ  Reference: U
ki_keywords: Step-Down DC/DC Module; ki_description: 3A Adjustable Step-Down DC/DC Power Module, Vin: 6-20V; ki_fp_filters: Texas*NDW*; Footprint: Package_TO_SOT_SMD:Texas_NDW-7_TabPin4; Datasheet: http://www.ti.com/lit/gpn/LMZ22003
pins: 1 VIN, 2 SYNC, 3 EN, 4 GND, 5 FB, 6 SS/TRK, 7 VOUT

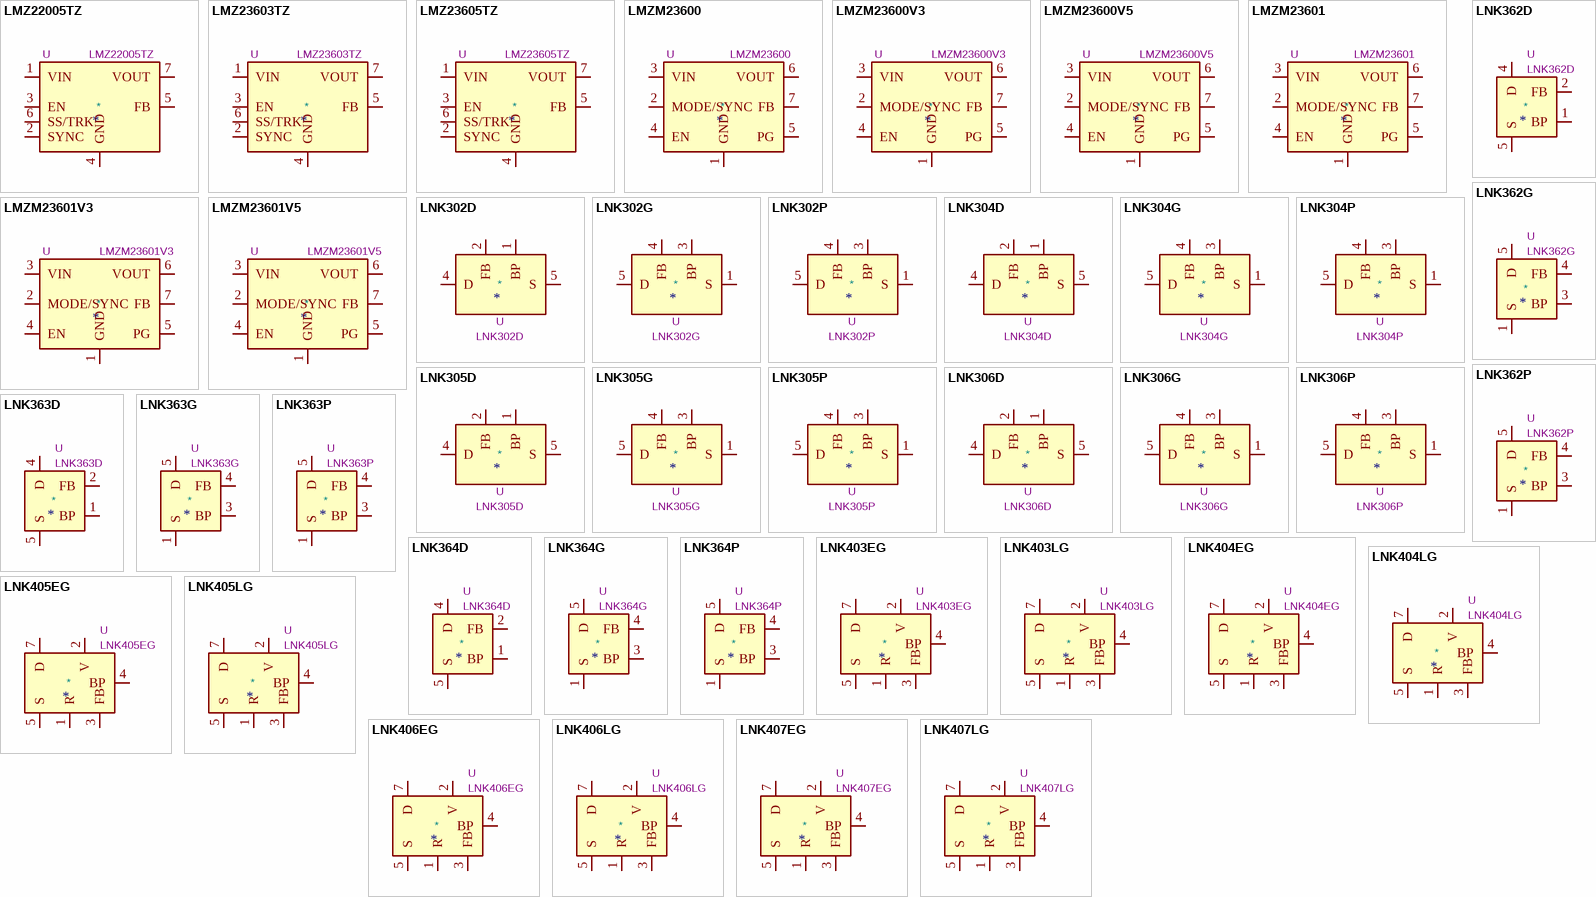
[diagram p8: symbols LMZ22005TZ to LNK407LG]

## LMZ22005TZ
designator *  value LMZ22005TZ  Reference: U
ki_keywords: Step-Down DC/DC Module; ki_description: 5A Adjustable Step-Down DC/DC Power Module, Vin: 6-20V; ki_fp_filters: Texas*NDW*; Footprint: Package_TO_SOT_SMD:Texas_NDW-7_TabPin4; Datasheet: http://www.ti.com/lit/gpn/LMZ22005
pins: 1 VIN, 2 SYNC, 3 EN, 4 GND, 5 FB, 6 SS/TRK, 7 VOUT

## LMZ23603TZ
designator *  value LMZ23603TZ  Reference: U
ki_keywords: Step-Down DC/DC Module; ki_description: 3A Adjustable Step-Down DC/DC Power Module, Vin: 6-36V; ki_fp_filters: Texas*NDW*; Footprint: Package_TO_SOT_SMD:Texas_NDW-7_TabPin4; Datasheet: http://www.ti.com/lit/gpn/lmz23603
pins: 1 VIN, 2 SYNC, 3 EN, 4 GND, 5 FB, 6 SS/TRK, 7 VOUT

## LMZ23605TZ
designator *  value LMZ23605TZ  Reference: U
ki_keywords: Step-Down DC/DC Module; ki_description: 5A Adjustable Step-Down DC/DC Power Module, Vin: 6-36V; ki_fp_filters: Texas*NDW*; Footprint: Package_TO_SOT_SMD:Texas_NDW-7_TabPin4; Datasheet: http://www.ti.com/lit/gpn/lmz23605
pins: 1 VIN, 2 SYNC, 3 EN, 4 GND, 5 FB, 6 SS/TRK, 7 VOUT

## LMZM23600
designator *  value LMZM23600  Reference: U
ki_keywords: Step-Down DC/DC Module; ki_description: 0.5A Adjustable Step-Down DC/DC Power Module in 3.8x3mm, MicroSIP-10; ki_fp_filters: Texas*SIL*1EP*3.8x3mm*P0.6mm*; Footprint: Package_LGA:Texas_SIL0010A_MicroSiP-10-1EP_3.8x3mm_P0.6mm_EP0.7x2.9mm_ThermalVias; Datasheet: http://www.ti.com/lit/ds/symlink/lmzm23600.pdf
pins: 1 GND, 2 MODE/SYNC, 3 VIN, 4 EN, 5 PG, 6 VOUT, 7 FB, 8 hidden, 9 hidden, 10 hidden, 11 GND hidden

## LMZM23600V3
designator *  value LMZM23600V3  Reference: U
ki_keywords: Step-Down DC/DC Module; ki_description: 0.5A 3.3V Step-Down DC/DC Power Module in 3.8x3mm, MicroSIP-10; ki_fp_filters: Texas*SIL*1EP*3.8x3mm*P0.6mm*; Footprint: Package_LGA:Texas_SIL0010A_MicroSiP-10-1EP_3.8x3mm_P0.6mm_EP0.7x2.9mm_ThermalVias; Datasheet: http://www.ti.com/lit/ds/symlink/lmzm23600.pdf
pins: 1 GND, 2 MODE/SYNC, 3 VIN, 4 EN, 5 PG, 6 VOUT, 7 FB, 8 hidden, 9 hidden, 10 hidden, 11 GND hidden

## LMZM23600V5
designator *  value LMZM23600V5  Reference: U
ki_keywords: Step-Down DC/DC Module; ki_description: 0.5A 5V Step-Down DC/DC Power Module in 3.8x3mm, MicroSIP-10; ki_fp_filters: Texas*SIL*1EP*3.8x3mm*P0.6mm*; Footprint: Package_LGA:Texas_SIL0010A_MicroSiP-10-1EP_3.8x3mm_P0.6mm_EP0.7x2.9mm_ThermalVias; Datasheet: http://www.ti.com/lit/ds/symlink/lmzm23600.pdf
pins: 1 GND, 2 MODE/SYNC, 3 VIN, 4 EN, 5 PG, 6 VOUT, 7 FB, 8 hidden, 9 hidden, 10 hidden, 11 GND hidden

## LMZM23601
designator *  value LMZM23601  Reference: U
ki_keywords: Step-Down DC/DC Module; ki_description: 1A Adjustable Step-Down DC/DC Power Module in 3.8x3mm, MicroSIP-10; ki_fp_filters: Texas*SIL*1EP*3.8x3mm*P0.6mm*; Footprint: Package_LGA:Texas_SIL0010A_MicroSiP-10-1EP_3.8x3mm_P0.6mm_EP0.7x2.9mm_ThermalVias; Datasheet: http://www.ti.com/lit/ds/symlink/lmzm23601.pdf
pins: 1 GND, 2 MODE/SYNC, 3 VIN, 4 EN, 5 PG, 6 VOUT, 7 FB, 8 hidden, 9 hidden, 10 hidden, 11 GND hidden

## LMZM23601V3
designator *  value LMZM23601V3  Reference: U
ki_keywords: Step-Down DC/DC Module; ki_description: 1A 3.3V Step-Down DC/DC Power Module in 3.8x3mm, MicroSIP-10; ki_fp_filters: Texas*SIL*1EP*3.8x3mm*P0.6mm*; Footprint: Package_LGA:Texas_SIL0010A_MicroSiP-10-1EP_3.8x3mm_P0.6mm_EP0.7x2.9mm_ThermalVias; Datasheet: http://www.ti.com/lit/ds/symlink/lmzm23601.pdf
pins: 1 GND, 2 MODE/SYNC, 3 VIN, 4 EN, 5 PG, 6 VOUT, 7 FB, 8 hidden, 9 hidden, 10 hidden, 11 GND hidden

## LMZM23601V5
designator *  value LMZM23601V5  Reference: U
ki_keywords: Step-Down DC/DC Module; ki_description: 1A 5V Step-Down DC/DC Power Module in 3.8x3mm, MicroSIP-10; ki_fp_filters: Texas*SIL*1EP*3.8x3mm*P0.6mm*; Footprint: Package_LGA:Texas_SIL0010A_MicroSiP-10-1EP_3.8x3mm_P0.6mm_EP0.7x2.9mm_ThermalVias; Datasheet: http://www.ti.com/lit/ds/symlink/lmzm23601.pdf
pins: 1 GND, 2 MODE/SYNC, 3 VIN, 4 EN, 5 PG, 6 VOUT, 7 FB, 8 hidden, 9 hidden, 10 hidden, 11 GND hidden

## LNK302D
designator *  value LNK302D  Reference: U
ki_keywords: Lowest Component Count, Energy-Efficient Off-Line Switcher IC; ki_description: LinkSwitch-TN Family, 80mA Output Current, SO-8C; ki_fp_filters: PowerIntegrations?SO?8B*; Footprint: Package_SO:PowerIntegrations_SO-8B; Datasheet: http://www.powerint.com/sites/default/files/product-docs/lnk302_304-306.pdf
pins: 1 BP, 2 FB, 4 D, 5 S, 6 S hidden, 7 S hidden, 8 S hidden

## LNK302G
designator *  value LNK302G  Reference: U
ki_keywords: Lowest Component Count, Energy-Efficient Off-Line Switcher IC; ki_description: LinkSwitch-TN Family, 80mA Output Current, SMD-8B; ki_fp_filters: PowerIntegrations?SMD?8B*; Footprint: Package_DIP:PowerIntegrations_SMD-8B; Datasheet: http://www.powerint.com/sites/default/files/product-docs/lnk302_304-306.pdf
pins: 1 S, 2 S hidden, 3 BP, 4 FB, 5 D, 7 S hidden, 8 S hidden

## LNK302P
designator *  value LNK302P  Reference: U
ki_keywords: Lowest Component Count, Energy-Efficient Off-Line Switcher IC; ki_description: LinkSwitch-TN Family, 80mA Output Current, DIP-8B; ki_fp_filters: PowerIntegrations?PDIP?8B*; Footprint: Package_DIP:PowerIntegrations_PDIP-8B; Datasheet: http://www.powerint.com/sites/default/files/product-docs/lnk302_304-306.pdf
pins: 1 S, 2 S hidden, 3 BP, 4 FB, 5 D, 7 S hidden, 8 S hidden

## LNK304D
designator *  value LNK304D  Reference: U
ki_keywords: Lowest Component Count, Energy-Efficient Off-Line Switcher IC; ki_description: LinkSwitch-TN Family, 170mA Output Current, SO-8C; ki_fp_filters: PowerIntegrations?SO?8B*; Footprint: Package_SO:PowerIntegrations_SO-8B; Datasheet: http://www.powerint.com/sites/default/files/product-docs/lnk302_304-306.pdf
pins: 1 BP, 2 FB, 4 D, 5 S, 6 S hidden, 7 S hidden, 8 S hidden

## LNK304G
designator *  value LNK304G  Reference: U
ki_keywords: Lowest Component Count, Energy-Efficient Off-Line Switcher IC; ki_description: LinkSwitch-TN Family, 170mA Output Current, SMD-8B; ki_fp_filters: PowerIntegrations?SMD?8B*; Footprint: Package_DIP:PowerIntegrations_SMD-8B; Datasheet: http://www.powerint.com/sites/default/files/product-docs/lnk302_304-306.pdf
pins: 1 S, 2 S hidden, 3 BP, 4 FB, 5 D, 7 S hidden, 8 S hidden

## LNK304P
designator *  value LNK304P  Reference: U
ki_keywords: Lowest Component Count, Energy-Efficient Off-Line Switcher IC; ki_description: LinkSwitch-TN Family, 170mA Output Current, DIP-8B; ki_fp_filters: PowerIntegrations?PDIP?8B*; Footprint: Package_DIP:PowerIntegrations_PDIP-8B; Datasheet: http://www.powerint.com/sites/default/files/product-docs/lnk302_304-306.pdf
pins: 1 S, 2 S hidden, 3 BP, 4 FB, 5 D, 7 S hidden, 8 S hidden